# Altium footprint library FOTA.PcbLib: 41 footprints (part 3 of 3)
Each footprint in its own frame and in the unit in brackets; x right, y up, seen from the top. Pads: shape width x height; smd on the part's side, far side on the other; paste and mask are expansions set on the pad; w line width, h text height; cw(c..) or ccw(c..) is an arc to the next point about the centre after c.
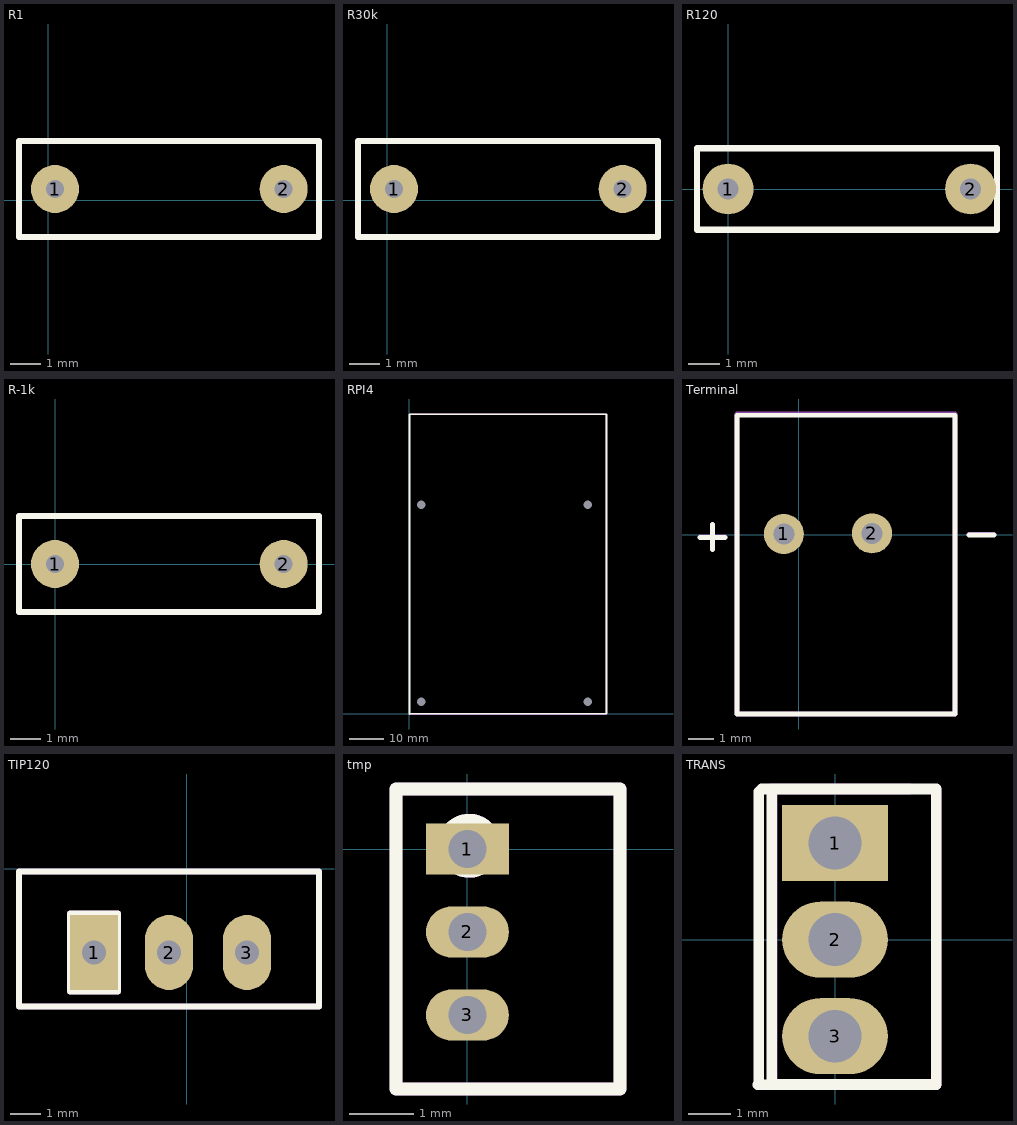
[diagram p2: the footprints below, top view; thin cyan lines are the x and y axes]

## R1 [mm]
pads (2):
  round 1.6 hole 0.6: 1(0.225,0.375) 2(7.845,0.375)
Top Overlay:
  lines w0.2: -0.975,-1.225 -0.975,1.975 9.025,1.975 9.025,-1.225 -0.975,-1.225
Mechanical 29:
  lines w0.2: -0.975,-1.225 9.025,-1.225 9.025,1.975 -0.975,1.975 -0.975,-1.225
3D body "Yageo CFR-25 Resistor Axial P7.62mm 1,0 Ohm.stp": height 2.44, standoff -3, extent -0.075,-0.769 8.095,1.519

## R30k [mm]
pads (2):
  round 1.6 hole 0.6: 1(0.225,0.375) 2(7.845,0.375)
Top Overlay:
  lines w0.2: -0.975,-1.225 -0.975,1.975 9.025,1.975 9.025,-1.225 -0.975,-1.225
Mechanical 29:
  lines w0.2: -0.975,-1.225 9.025,-1.225 9.025,1.975 -0.975,1.975 -0.975,-1.225
3D body "Yageo CFR-25 Resistor Axial P7.62mm 30,0 kOhm.stp": height 2.44, standoff -3, extent -0.05,-0.769 8.12,1.519

## R120 [mm]
pads (2):
  round 1.6 hole 0.65: 1(0,0) 2(7.62,0)
Top Overlay:
  lines w0.2: -0.975,-1.275 8.45,-1.275 8.45,1.275 -0.975,1.275 -0.975,-1.275
Mechanical 29:
  text "'.Designator'" at 0.275,-0.925 h1.02
3D body "Yageo CFR-25 Resistor Axial P7.62mm 120,0 Ohm.stp": height 2.44, standoff -3, extent -0.275,-1.144 7.895,1.144

## R-1k [mm]
pads (2):
  round 1.6 hole 0.6: 1(0,0) 2(7.62,0)
Top Overlay:
  lines w0.2: -1.2,-1.6 8.8,-1.6 8.8,1.6 -1.2,1.6 -1.2,-1.6
Mechanical 29:
  lines w0.2: -1.2,-1.6 -1.2,1.6 8.8,1.6 8.8,-1.6 -1.2,-1.6
3D body "Yageo CFR-25 Resistor Axial P7.62mm 1,0 kOhm.stp": height 2.44, standoff -3, extent -0.185,-1.187 7.985,1.1

## RPI4 [mm]
pads (4):
  round 0 hole 2.5 unplated: 1(3.5,3.5) 1(3.5,61.5) 1(52.5,3.5) 1(52.5,61.5)
Top Overlay:
  lines w0.5: 0.05,-0.1 0.05,88.1 58,88.1 58,0 48.8,0 0.15,0
Mechanical 2:
  lines w0.254: 0.05,-0.1 57.8,-0.1 57.8,88.2 0.05,88.2
  text ".Designator" at 28.8,9.7 h8
3D body "User Library-Raspberry-Pi-4-Model-B-03.step": height 15.7, standoff -3.94, extent -0.05,0 57.85,87.94

## Terminal [mm]
pads (2):
  round 1.6 hole 0.838: 1(-0.6,0.025) 2(2.925,0.05)
Top Overlay:
  lines w0.2: -3.95,-0.115 -2.96,-0.115 ; -3.46,-0.595 -3.46,0.395 ; 6.81,-0.015 7.8,-0.015 ; -2.475,-7.175 6.25,-7.175 6.25,4.775 -2.475,4.775 -2.475,-7.175
Mechanical 29:
  lines w0.2: -3.95,-0.105 -2.96,-0.105 ; -3.46,-0.585 -3.46,0.405 ; 6.81,-0.005 7.8,-0.005 ; -2.475,-7.175 -2.475,4.825 6.25,4.825 6.25,-7.175 -2.475,-7.175
  text "'.Designator'" at -4.625,-3.075 h1.02
3D body "1984963.stp": height 13.35, standoff -3.25, extent -2.35,-7.175 6.15,4.825

## TIP120 [mm]
pads (3):
  rect 1.6x2.5 hole 0.8: 1(-3.1,-2.8)
  oval 1.6x2.5 hole 0.8: 2(-0.6,-2.8) 3(2,-2.8)
Top Overlay:
  lines w0.2: -5.6,-4.6 4.4,-4.6 4.4,-0.1 -5.6,-0.1 -5.6,-4.6 ; -3.9,-4.1 -3.9,-1.5 -2.3,-1.5 -2.3,-4.1 -3.9,-4.1
Mechanical 29:
  lines w0.2: -5.6,-4.6 -5.6,-0.1 4.4,-0.1 4.4,-4.6 -5.6,-4.6 ; -3.9,-4.1 -2.3,-4.1 -2.3,-1.5 -3.9,-1.5 -3.9,-4.1
  text "'.Designator'" at -5.8,-1.1 h1.02
3D body "User Library-TIP120 Transistors Darlington NPN TO-220 3L.step": height 18.79, standoff -9.99, extent -5.655,-5.425 4.505,2.008

## tmp [mm]
pads (3):
  rect 1.3x0.8 hole 0.6: 1(0,0)
  oval 1.3x0.8 hole 0.6: 2(0,-1.3) 3(0,-2.6)
Top Overlay:
  circle w0.508: c0.025,0.051 r0.246
  lines w0.2: -1.118,-3.759 -1.118,0.94 2.388,0.94 2.388,-3.759 -1.118,-3.759
Mechanical 29:
  circle w0.508: c0.025,0.051 r0.246
  lines w0.2: -1.118,-3.759 2.388,-3.759 2.388,0.94 -1.118,0.94 -1.118,-3.759
  text "'.Designator'" at -2.845,-3.658 h1.02
3D body "DS18B20.SLDPRT": height 4.59, standoff -14.46, extent -1.196,-3.564 2.364,1.016

## TRANS [mm]
pads (3):
  rect 2.5x1.8 hole 1.25: 1(0,2.286)
  oval 2.5x1.8 hole 1.25: 2(0,0) 3(0,-2.286)
Top Overlay:
  lines w0.25: -1.832,-3.432 -1.5,-3.432 ; -1.8,-3.432 -1.8,3.5 -1.734,3.566 -1.5,3.566
  lines w0.254: -1.5,-3.432 -1.5,3.566 2.4,3.566 2.4,-3.432 -1.5,-3.432
Mechanical 2:
  lines w0.254: -1.5,-3.432 2.4,-3.432 2.4,3.556 ; -1.5,3.566 1.765,3.566 ; -1.484,-3.258 -1.484,3.556
  text ".Designator" at 0.6,3 h1.27
3D body "2N2222_1675266263.214.step": height 6.73, standoff -10.37, extent -1.385,-2.782 2.3,2.782